# Altium footprint library XU-GENARAL PCB .PcbLib: 1176 footprints (part 35 of 75)
Each footprint in its own frame and in the unit in brackets; x right, y up, seen from the top. Pads: shape width x height; smd on the part's side, far side on the other; paste and mask are expansions set on the pad; w line width, h text height; cw(c..) or ccw(c..) is an arc to the next point about the centre after c.
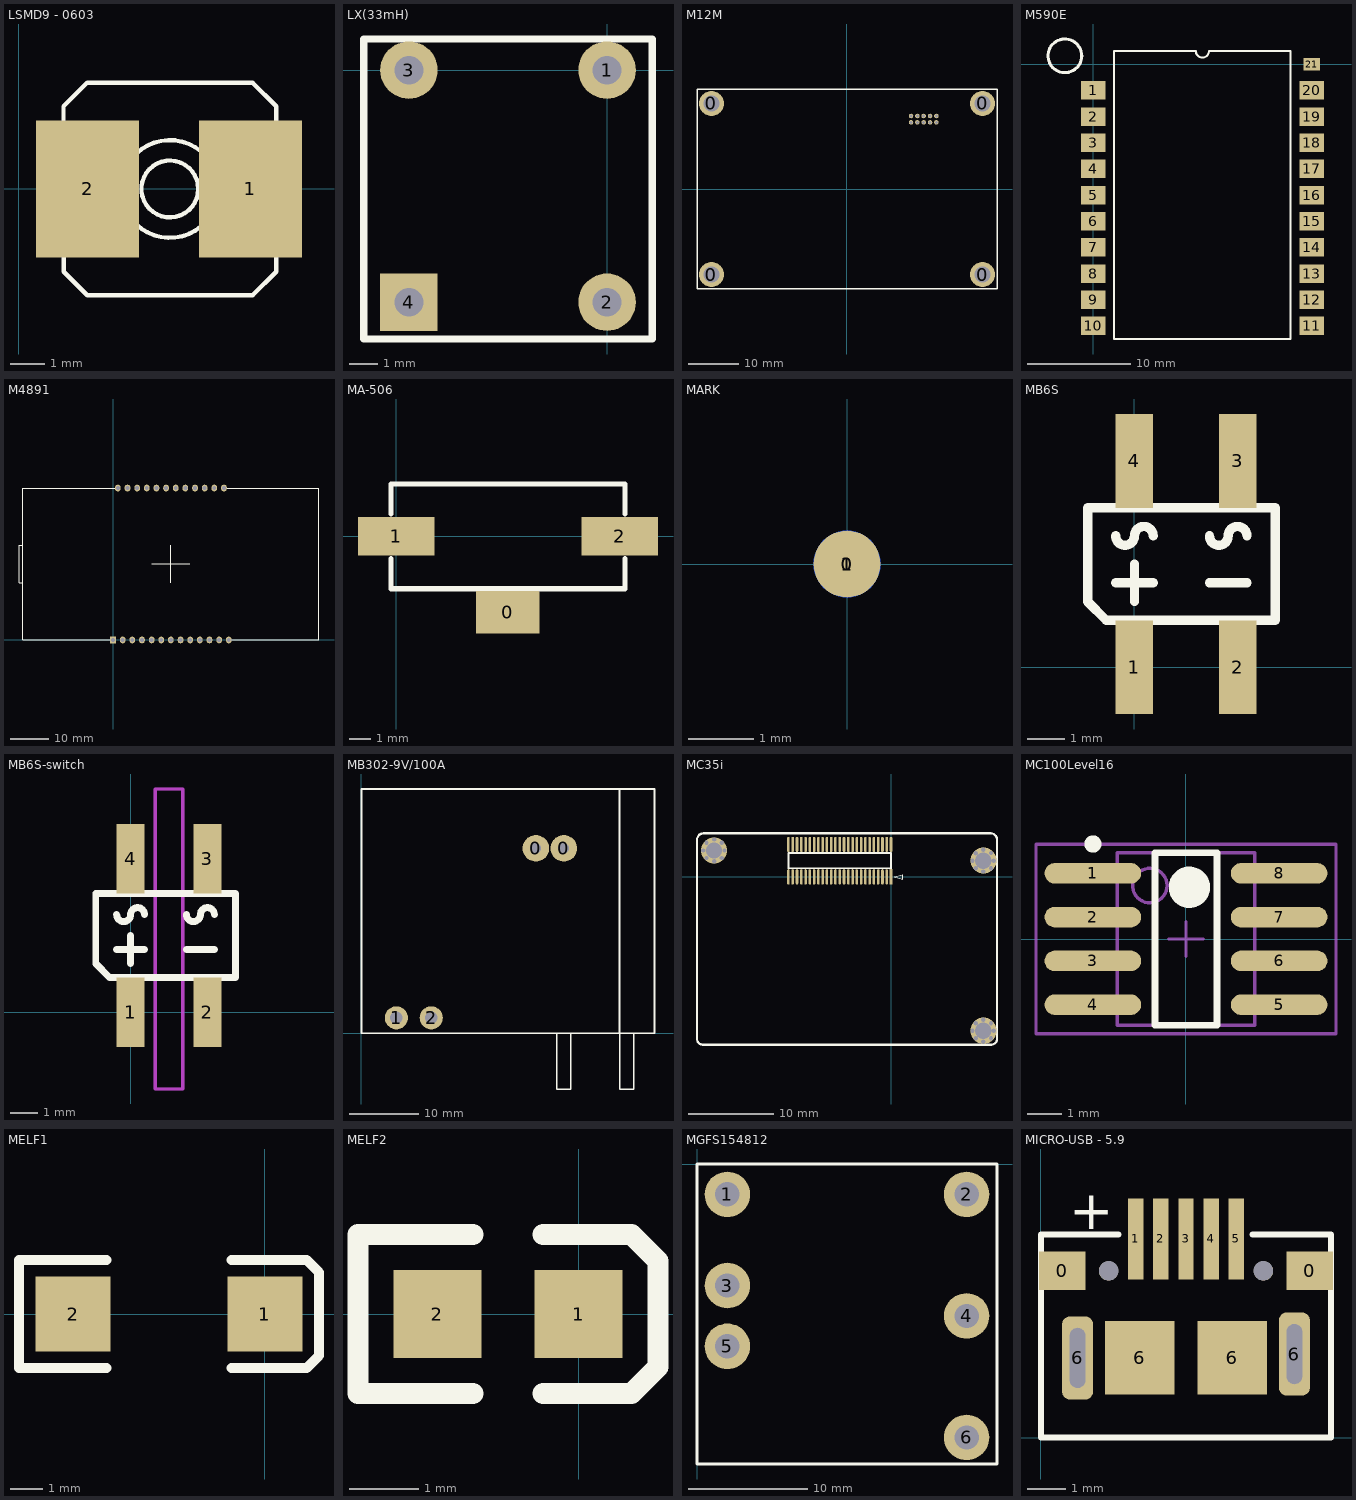
[diagram p34: the footprints below, top view; thin cyan lines are the x and y axes]

## LSMD9 - 0603 [mm]
height 1.1
pads (2):
  rect 3x4 smd: 1(6.75,0) 2(2,0)
Top Overlay:
  circle w0.127: c4.4,0 r1.424
  circle w0.127: c4.4,0 r0.829
  lines w0.127: 1.3,1.701 1.3,2.412 1.986,3.098 6.814,3.098 7.5,2.412 7.5,1.701 ; 1.302,-1.703 1.302,-2.414 1.988,-3.1 6.814,-3.1 7.5,-2.414 7.5,-1.703

## LX(33mH) [mil]
pads (4):
  round 80 hole 40: 1(0,0) 2(0,-322.83) 3(-275.59,0)
  rect 80x80 hole 40: 4(-275.59,-322.83)
Top Overlay:
  lines w10: 62,43 -338.58,43.31 -338.58,-374.02 63,-374 62.99,43.31

## M12M [mm]
pads (14):
  round 5 hole 3.2: 0(-27.1,-17.1) 0(-27.1,17.1) 0(27.1,-17.1) 0(27.1,17.1)
  round 0.9 hole 0.6: 1(12.8,14.6) 2(12.8,13.33) 3(14.07,14.6) 4(14.07,13.33) 5(15.34,14.6) 6(15.34,13.33) 7(16.61,14.6) 8(16.61,13.33) 9(17.88,14.6) 10(17.88,13.33)
Top Overlay:
  lines w0.254: -30,-20 30,-20 30,20 -30,20 -30,-20

## M590E [mm]
pads (21):
  rect 2.4x1.8 smd: 1(0,-2.54) 2(0,-5.08) 3(0,-7.62) 4(0,-10.16) 5(0,-12.7) 6(0,-15.24) 7(0,-17.78) 8(0,-20.32) 9(0,-22.86) 10(0,-25.4) 11(21.2,-25.4) 12(21.2,-22.86) 13(21.2,-20.32) 14(21.2,-17.78) 15(21.2,-15.24) 16(21.2,-12.7) 17(21.2,-10.16) 18(21.2,-7.62) 19(21.2,-5.08) 20(21.2,-2.54)
  rect 1.6x1.2 smd: 21(21.2,0)
Top Overlay:
  circle w0.305: c-2.752,0.813 r1.635
  lines w0.2: 2.035,-26.67 19.165,-26.67 19.165,1.27 11.235,1.27 cw(c10.6,1.27) 9.965,1.27 2.035,1.27 2.035,-26.67

## M4891 [mil]
pads (25):
  rect 59.05x70 hole 40: 1(0,0)
  oval 59.05x70 hole 40: 2(100,0) 3(200,0) 4(300,0) 5(400,0) 6(500,0) 7(600,0) 8(700,0) 9(800,0) 10(900,0) 11(1000,0) 12(1100,0) 13(1200,0) 14(1150,1574.8) 15(1050,1574.8) 16(950,1574.8) 17(850,1574.8) 18(750,1574.8) 19(650,1574.8) 20(550,1574.8) 21(450,1574.8) 22(350,1574.8) 23(250,1574.8) 24(150,1574.8) 25(50,1574.8)
Top Overlay:
  lines w10: -935.43,590.55 -974.8,590.55 -974.8,984.25 -935.43,984.25 ; 0,0 -935.43,0 -935.43,1574.8 50,1574.8 ; 403.15,787.4 796.85,787.4 ; 600,590.55 600,984.25 ; 1150,1574.8 2135.43,1574.8 2135.43,0 1200,0

## MA-506 [mm]
pads (3):
  rect 3x2 smd: 0(5.24,-3.559)
  rect 3.6x1.8 smd: 1(0,0) 2(10.5,0)
Top Overlay:
  lines w0.254: -0.25,-1.05 -0.25,-2.46 10.75,-2.46 10.75,-1.05 ; -0.25,1.05 -0.25,2.46 10.75,2.46 10.75,1.05

## MARK [mil]
pads (4):
  round 40 smd: 0(0,0)
  round 40 smd far side: 0(0,0)
  round 180 on Top Solder: 1(0,0)
  round 180 on Bottom Solder: 1(0,0)

## MB6S [mil]
pads (4):
  rect 40x100 smd: 1(0,0) 2(110,0) 3(110,220) 4(0,220)
Top Overlay:
  lines w10: -20,90 20,90 ; -20,140 ccw(c-10,140) 0,140 cw(c10,140) 20,140 ; 0,70 0,110 ; 80,90 120,90 ; 80,140 ccw(c90,140) 100,140 cw(c110,140) 120,140 ; -50,70 -50,170 150,170 150,50 -30,50 -50,70

## MB6S-switch [mil]
pads (4):
  rect 40x100 smd: 1(0,0) 2(110,0) 3(110,220) 4(0,220)
Top Overlay:
  lines w10: -20,90 20,90 ; -20,140 ccw(c-10,140) 0,140 cw(c10,140) 20,140 ; 0,70 0,110 ; 80,90 120,90 ; 80,140 ccw(c90,140) 100,140 cw(c110,140) 120,140 ; -50,70 -30,50 150,50 150,170 -50,170 -50,70
Keep-Out Layer:
  lines w5: 35,-110 35,-90 35,320 75,320 75,130 75,-110 35,-110
Mechanical 1:
  lines w5: 35,-110 35,-90 35,320 75,320 75,130 75,-110 35,-110

## MB302-9V/100A [mil]
pads (4):
  round 150 hole 60: 0(984.25,1043.31) 0(1141.73,1043.31)
  round 130 hole 70: 1(196.85,86.61) 2(393.7,86.61)
Top Overlay:
  lines w8: 1102.36,0 1102.36,-314.96 1181.1,-314.96 1181.1,0 ; 1456.69,0 1456.69,-314.96 1535.43,-314.96 1535.43,0
  lines w10: 1456.69,0 1456.69,1377.95 ; 0,0 1653.54,0 1653.54,1377.95 0,1377.95 0,0

## MC35i [mm]
pads (50):
  rect 0.3x1.8 smd: 1(0,0)
  oval 0.3x1.8 smd: 2(-0.5,0) 3(-1,0) 4(-1.5,0) 5(-2,0) 6(-2.5,0) 7(-3,0) 8(-3.5,0) 9(-4,0) 10(-4.5,0) 11(-5,0) 12(-5.5,0) 13(-6,0) 14(-6.5,0) 15(-7,0) 16(-7.5,0) 17(-8,0) 18(-8.5,0) 19(-9,0) 20(-9.5,0) 21(-10,0) 22(-10.5,0) 23(-11,0) 24(-11.5,0) 25(-12,0) 26(-12,3.8) 27(-11.5,3.8) 28(-11,3.8) 29(-10.5,3.8) 30(-10,3.8) 31(-9.5,3.8) 32(-9,3.8) 33(-8.5,3.8) 34(-8,3.8) 35(-7.5,3.8) 36(-7,3.8) 37(-6.5,3.8) 38(-6,3.8) 39(-5.5,3.8) 40(-5,3.8) 41(-4.5,3.8) 42(-4,3.8) 43(-3.5,3.8) 44(-3,3.8) 45(-2.5,3.8) 46(-2,3.8) 47(-1.5,3.8) 48(-1,3.8) 49(-0.5,3.8) 50(0,3.8)
via 10.8,-16.73 diameter 0.508 hole 0.508
via 12.023,-18 diameter 0.508 hole 0.508
via 10.8,-19.27 diameter 0.508 hole 0.508
via 9.53,-18 diameter 0.508 hole 0.508
via 9.908,-18.892 diameter 0.508 hole 0.508
via 11.693,-18.893 diameter 0.508 hole 0.508
via 11.692,-17.108 diameter 0.508 hole 0.508
via 9.915,-17.115 diameter 0.508 hole 0.508
via 10.8,-18 diameter 3.048 hole 1.905
via 10.8,3.17 diameter 0.508 hole 0.508
via 12.023,1.9 diameter 0.508 hole 0.508
via 10.8,0.63 diameter 0.508 hole 0.508
via 9.53,1.9 diameter 0.508 hole 0.508
via 9.908,1.008 diameter 0.508 hole 0.508
via 11.693,1.007 diameter 0.508 hole 0.508
via 11.692,2.792 diameter 0.508 hole 0.508
via 9.915,2.785 diameter 0.508 hole 0.508
via 10.8,1.9 diameter 3.048 hole 1.905
via 10.8,3.17 diameter 0.508 hole 0.508
via 12.023,1.9 diameter 0.508 hole 0.508
via 10.8,0.63 diameter 0.508 hole 0.508
via 9.53,1.9 diameter 0.508 hole 0.508
via 9.908,1.008 diameter 0.508 hole 0.508
via 11.693,1.007 diameter 0.508 hole 0.508
via 11.692,2.792 diameter 0.508 hole 0.508
via 9.915,2.785 diameter 0.508 hole 0.508
via -20.7,4.37 diameter 0.508 hole 0.508
via -19.477,3.1 diameter 0.508 hole 0.508
via -20.7,1.83 diameter 0.508 hole 0.508
via -21.97,3.1 diameter 0.508 hole 0.508
via -21.592,2.208 diameter 0.508 hole 0.508
via -19.807,2.207 diameter 0.508 hole 0.508
via -19.808,3.992 diameter 0.508 hole 0.508
via -21.585,3.985 diameter 0.508 hole 0.508
via -20.7,3.1 diameter 3.048 hole 1.905
Top Overlay:
  lines w0.1: 0.381,0 1.381,0.25 1.381,-0.25 0.381,0
  lines w0.2: -12,1.016 0,1.016 ; -12,2.8 0,2.8
  lines w0.254: -12,1.016 -12,2.8 ; 0,1.016 0,2.8 ; -22.7,-18.956 ccw(c-22.03,-18.956) -22.03,-19.626 11.743,-19.626 ccw(c11.743,-18.969) 12.4,-18.969 12.4,4.364 ccw(c11.664,4.364) 11.664,5.1 -21.951,5.1 ccw(c-21.951,4.351) -22.7,4.351 -22.7,-18.956

## MC100Level16 [mm] "SOIC, 8-Leads, Body 5.0x4.0mm (max), Pitch 1.27mm, IPC Medium Density"
height 1.75
pads (8):
  oval 2.8x0.6 smd: 1(-2.7,1.905) 2(-2.7,0.635) 3(-2.7,-0.635) 4(-2.7,-1.905) 5(2.7,-1.905) 6(2.7,-0.635) 7(2.7,0.635) 8(2.7,1.905)
Top Overlay:
  circle w0.6: c0.1,1.5 r0.3
  circle w0.25: c-2.7,2.755 r0.125
  lines w0.2: -0.9,-2.5 0.9,-2.5 0.9,2.5 -0.9,2.5 -0.9,-2.5
Mechanical 13:
  circle w0.1: c-1.05,1.55 r0.5
  lines w0.1: -2,-2.5 2,-2.5 2,2.5 -2,2.5 -2,-2.5
Mechanical 15:
  lines w0.1: -0.5,0 0.5,0 ; 0,-0.5 0,0.5 ; -4.35,-2.75 4.35,-2.75 4.35,2.75 -4.35,2.75 -4.35,-2.75
3D body: height 1.75, standoff 0.19, extent -2,-2.5 2,2.5

## MELF1 [mil]
pads (2):
  rect 90x90 smd: 1(0,0) 2(-230,0)
Top Overlay:
  lines w12: -190,-65 -295,-65 -295,65 -190,65 ; -40,-65 50,-65 65,-50 65,50 50,65 -40,65

## MELF2 [mil]
pads (2):
  rect 50x50 smd: 1(0,0) 2(-80,0)
Top Overlay:
  lines w12: -60,-45 -125,-45 -125,45 -60,45 ; -20,-45 30,-45 45,-30 45,30 30,45 -20,45

## MGFS154812 [mil]
pads (6):
  round 150 hole 80: 1(100,-100) 2(887.4,-100) 3(100,-400) 4(887.4,-500) 5(100,-600) 6(887.4,-900)
Top Overlay:
  lines w10: 0,-987.4 987.4,-987.4 987.4,0 0,0 0,-987.4

## MICRO-USB - 5.9 [mm]
pads (13):
  rect 1.2x1 smd: 0(0.55,4.307) 0(6.95,4.307)
  rect 0.4x2.1 smd: 1(2.45,5.132) 2(3.1,5.132) 3(3.75,5.132) 4(4.4,5.132) 5(5.05,5.132)
  rrect50% 0.8x2.15 hole 0.4 slot 1.55 at 90 deg: 6(0.95,2.057) 6(6.55,2.157)
  rect 1.8x1.9 smd: 6(2.556,2.057) 6(4.943,2.057)
  round 0.5 hole 0.5 unplated: ""(1.75,4.307) ""(5.75,4.307)
Top Overlay:
  lines w0.152: 2.007,5.25 0,5.25 0,0 7.5,0 7.5,5.25 5.469,5.25
  text "+" at 0.737,5.385 h1